# Altium footprint library NDLib.PCBLIB: 499 footprints (part 3 of 32)
Each footprint in its own frame and in the unit in brackets; x right, y up, seen from the top. Pads: shape width x height; smd on the part's side, far side on the other; paste and mask are expansions set on the pad; w line width, h text height; cw(c..) or ccw(c..) is an arc to the next point about the centre after c.
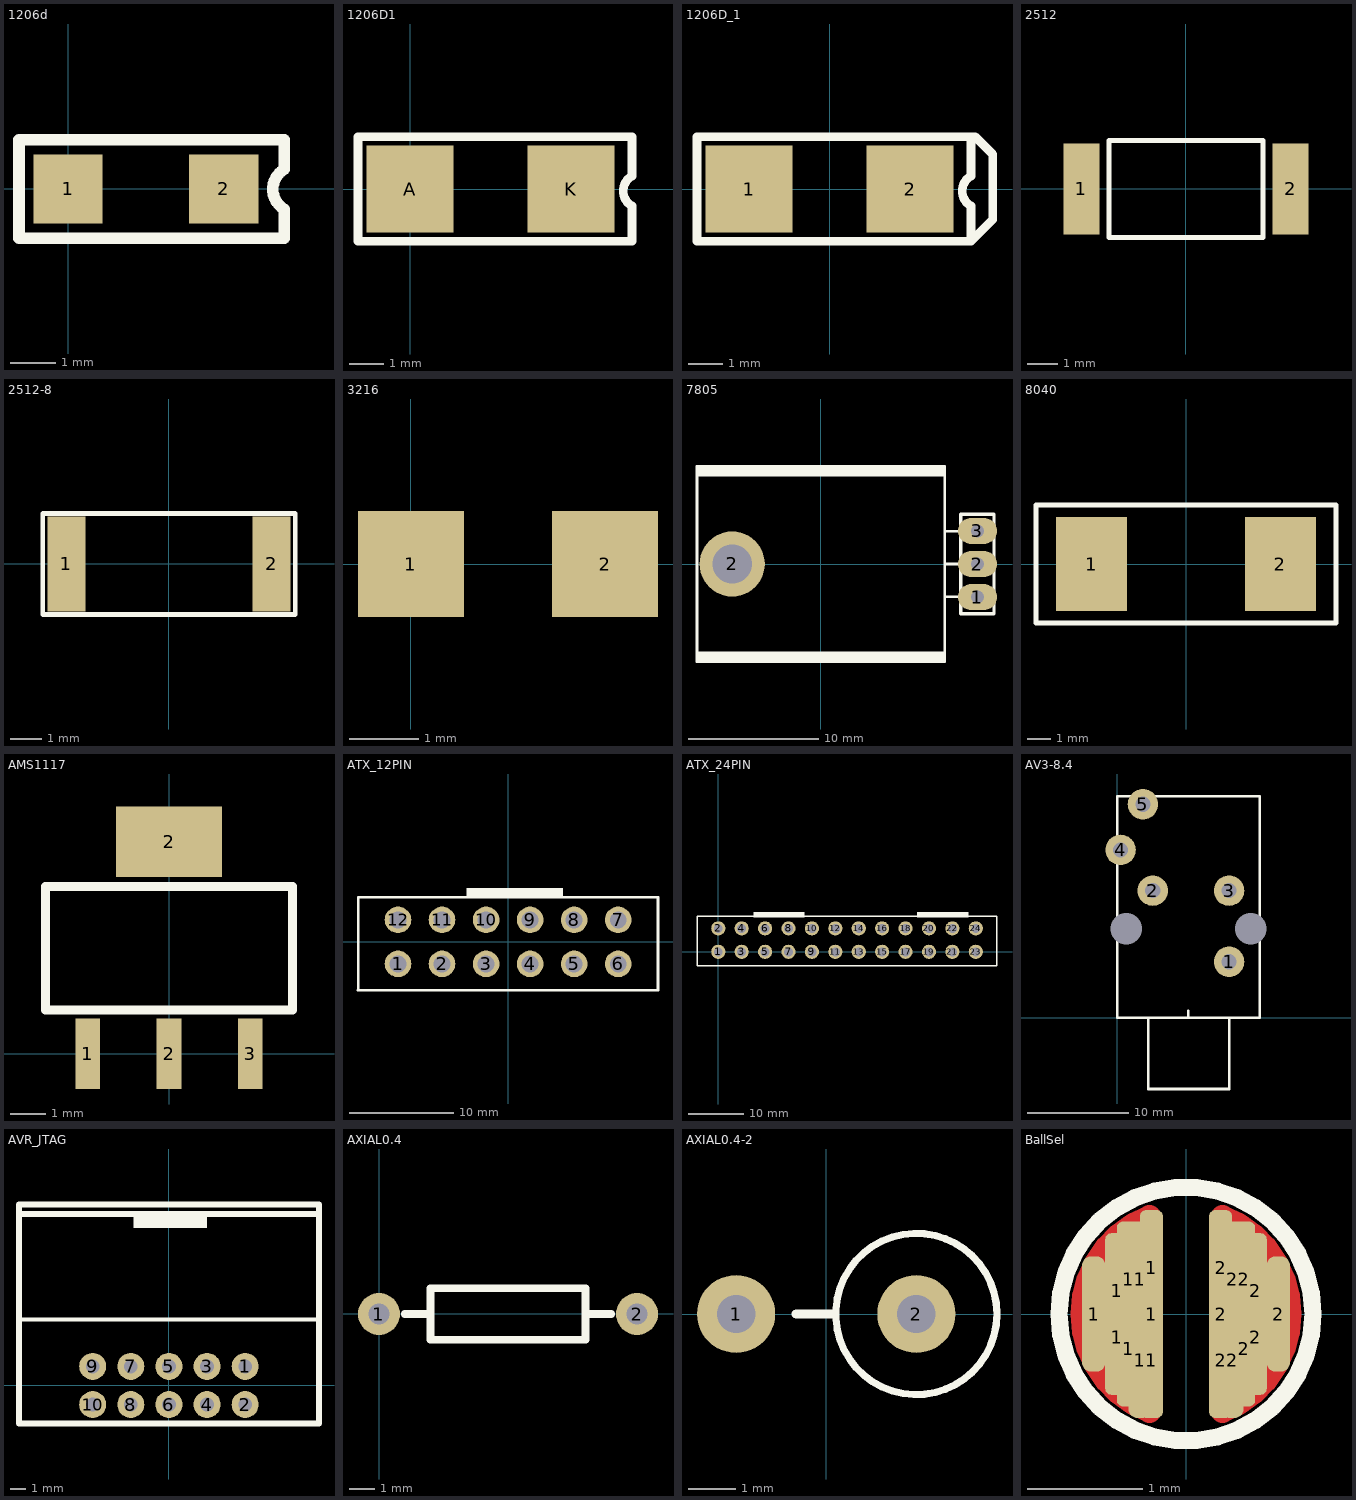
[diagram p2: the footprints below, top view; thin cyan lines are the x and y axes]

## 1206d [mil]
pads (2):
  rect 60x60 smd: 1(0,0) 2(135,0)
TopOverlay:
  lines w10: 47.5,-42.5 187.5,-42.5 187.5,-17.5 cw(c197.5,-0.18) 187.5,17.14 ; 50,-42.5 -42.5,-42.5 -42.5,42.5 50,42.5 187.5,42.5 187.5,17.5

## 1206D1 [mil]
pads (2):
  rect 100x100 smd: A(0,0) K(185,0)
TopOverlay:
  lines w10: 255,-20 255,-60 -60,-60 -60,60 255,60 255,14.64 ; 255,-19.64 cw(c265,-2.32) 255,15

## 1206D_1 [mil]
pads (2):
  rect 100x100 smd: 1(-92.5,0) 2(92.5,0)
TopOverlay:
  lines w10: 162.5,-20 162.5,-60 ; 162.5,-19.64 cw(c172.5,-2.32) 162.5,15 ; 162.5,14.64 162.5,60 ; 162.5,-60 187.5,-35 187.5,40 167.5,60 162.5,60 ; 162.5,-60 -152.5,-60 -152.5,60 162.5,60

## 2512 [mm]
pads (2):
  rect 1.2x3 smd: 1(-3.45,0) 2(3.45,0)
TopOverlay:
  lines w0.154: -2.54,-1.6 2.54,-1.6 2.54,1.6 -2.54,1.6 -2.54,-1.6

## 2512-8 [mm]
pads (2):
  rect 1.2x3 smd: 1(-3.25,0) 2(3.25,0)
TopOverlay:
  lines w0.154: -4,-1.6 -4,1.6 4,1.6 4,-1.6 -4,-1.6

## 3216 [mil]
pads (2):
  rect 60x60 smd: 1(0,0) 2(110,0)

## 7805 [mm]
pads (4):
  oval 3x2 hole 1: 1(11.996,-2.535) 2(11.996,0.005) 3(11.996,2.545)
  round 5 hole 3: 2(-6.804,0.005)
TopOverlay:
  rectangle: -9.503,-7.495 9.497,-6.695
  region: 9.496,7.504 -9.504,7.504 -9.504,6.704 9.496,6.704
  lines w0.2: 9.496,2.505 10.726,2.505 ; 9.596,-2.495 10.726,-2.495 ; 9.596,0.005 10.726,0.005 ; -9.504,7.505 -9.504,-7.495 9.496,-7.495 9.496,7.505 ; -9.504,7.505 9.496,7.505 ; -9.504,7.505 9.496,7.505
  lines w0.254: 10.726,-3.805 13.266,-3.805 13.266,3.815 10.726,3.815 10.726,-3.805

## 8040 [mm]
pads (2):
  rect 3x4 smd: 1(-4,0) 2(4,0)
TopOverlay:
  lines w0.2: -6.35,-2.5 -6.35,2.5 6.35,2.5 6.35,-2.5 -6.35,-2.5

## AMS1117 [mm]
pads (4):
  rect 0.7x2 smd: 1(-2.3,0) 2(0,0) 3(2.3,0)
  rect 3x2 smd: 2(0,6)
TopOverlay:
  lines w0.254: -3.5,1.235 -3.5,4.735 3.5,4.735 3.5,1.235 -3.5,1.235
3D body: height 1.7, standoff 0, extent -3.25,-0.48 3.25,6.48

## ATX_12PIN [mm]
pads (12):
  round 2.54 hole 1.6: 1(-10.5,-2.1) 2(-6.3,-2.1) 3(-2.1,-2.1) 4(2.1,-2.1) 5(6.3,-2.1) 6(10.5,-2.1) 7(10.5,2.1) 8(6.3,2.1) 9(2.1,2.1) 10(-2.1,2.1) 11(-6.3,2.1) 12(-10.5,2.1)
TopOverlay:
  rectangle: -3.984,4.25 5.233,5.16
  lines w0.254: -14.317,-4.609 -14.308,-4.6 ; -14.308,-4.6 -14.308,4.25 14.3,4.25 14.3,-4.6 -14.308,-4.6

## ATX_24PIN [mm]
pads (24):
  round 2.54 hole 1.6: 1(0,0) 2(0,4.2) 3(4.2,0) 4(4.2,4.2) 5(8.4,0) 6(8.4,4.2) 7(12.6,0) 8(12.6,4.2) 9(16.8,0) 10(16.8,4.2) 11(21,0) 12(21,4.2) 13(25.2,0) 14(25.2,4.2) 15(29.4,0) 16(29.4,4.2) 17(33.6,0) 18(33.6,4.2) 19(37.8,0) 20(37.8,4.2) 21(42,0) 22(42,4.2) 23(46.2,0) 24(46.2,4.2)
TopOverlay:
  rectangle: 6.283,6.19 15.5,7.1
  rectangle: 35.683,6.19 44.9,7.1
  lines w0.254: -3.817,-2.509 -3.808,-2.5 ; -3.808,-2.5 50.008,-2.5 50.008,6.35 -3.808,6.35 -3.808,-2.5

## AV3-8.4 [mm]
pads (7):
  round 3 hole 1.5: 1(11,5.5) 2(3.5,12.5) 3(11,12.5) 4(0.325,16.5) 5(2.525,21)
  round 3 hole 3.1 unplated: ""(0.9,8.75) ""(13.15,8.75)
TopOverlay:
  lines w0.254: 3.04,0 3.04,-7.02 11.02,-7.02 11.02,0 ; 7,0 7,0.66 ; 0,0 14,0 14,21.8 0,21.8 0,0
3D body: height 40.92, standoff -4.32, extent 0.3,-8.208 17.115,23.008

## AVR_JTAG [mm]
pads (10):
  round 1.8 hole 0.914: 1(5.08,1.27) 2(5.08,-1.27) 3(2.54,1.27) 4(2.54,-1.27) 5(0,1.27) 6(0,-1.27) 7(-2.54,1.27) 8(-2.54,-1.27) 9(-5.08,1.27) 10(-5.08,-1.27)
TopOverlay:
  region: 2.54,11.43 -2.36,11.43 -2.36,10.5 2.54,10.5
  lines w0.254: -9.996,4.39 10.004,4.39
  lines w0.381: -9.996,11.43 -2.79,11.43 ; -4.416,11.43 2.79,11.43 9.996,11.43 ; -9.996,-2.54 -9.996,12.07 10.004,12.07 10.004,-2.54 -9.996,-2.54
BottomOverlay:
  region: 7.112,-0.508 6.604,-0.508 6.604,-2.032 7.112,-2.032
  region: 6.096,-1.016 6.096,-1.524 7.62,-1.524 7.62,-1.016
  text "mi" at -4.275,2.692 h2.03
  text "ck" at -1.887,2.711 h2.03
  text "nc" at 3.031,2.711 h2.03
  text "mo" at 6.185,2.711 h2.03
  text "re" at 0.309,2.711 h2.03

## AXIAL0.4 [mil]
pads (2):
  round 65 hole 32: 1(-0.53,-0.37) 2(399.48,-0.37)
TopOverlay:
  lines w12: 39.48,-0.37 79.47,-0.37 ; 319.48,-0.37 359.48,-0.37 ; 79.47,-40.37 79.47,39.63 319.48,39.63 319.48,-40.37 79.47,-40.37
3D body: height 115.5, standoff -100, extent -12,-45.5 412,45.5

## AXIAL0.4-2 [mil]
pads (2):
  round 65 hole 32: 1(-75,0) 2(75,0)
TopOverlay:
  circle w6: c75,0 r67.08
  lines w7.87: -25,0 5,0

## BallSel [mm]
pads (20):
  rrect75% 0.2x1 smd mask+0: 1(-0.8,0) 1(-0.4,-0.4) 2(0.4,-0.4) 2(0.8,0)
  rrect50% 0.2x1 smd mask+0: 1(-0.6,-0.2) 1(-0.6,0.2) 1(-0.5,-0.3) 1(-0.5,0.3) 1(-0.4,0.3) 1(-0.3,-0.4) 1(-0.3,0) 1(-0.3,0.4) 2(0.3,-0.4) 2(0.3,0) 2(0.3,0.4) 2(0.4,0.3) 2(0.5,-0.3) 2(0.5,0.3) 2(0.6,-0.2) 2(0.6,0.2)
TopLayer:
  lines w0.2: -0.316,-0.843 cw(c0,0) -0.316,0.843 ; 0.316,-0.843 ccw(c0,0) 0.316,0.843
TopOverlay:
  circle w0.15: c0,0 r1.1
TopSolder:
  lines w0.2: -0.316,-0.843 cw(c0,0) -0.316,0.843 ; 0.316,-0.843 ccw(c0,0) 0.316,0.843